# Altium footprint library PCBKU.PcbLib: 197 footprints (part 11 of 13)
Each footprint in its own frame and in the unit in brackets; x right, y up, seen from the top. Pads: shape width x height; smd on the part's side, far side on the other; paste and mask are expansions set on the pad; w line width, h text height; cw(c..) or ccw(c..) is an arc to the next point about the centre after c.
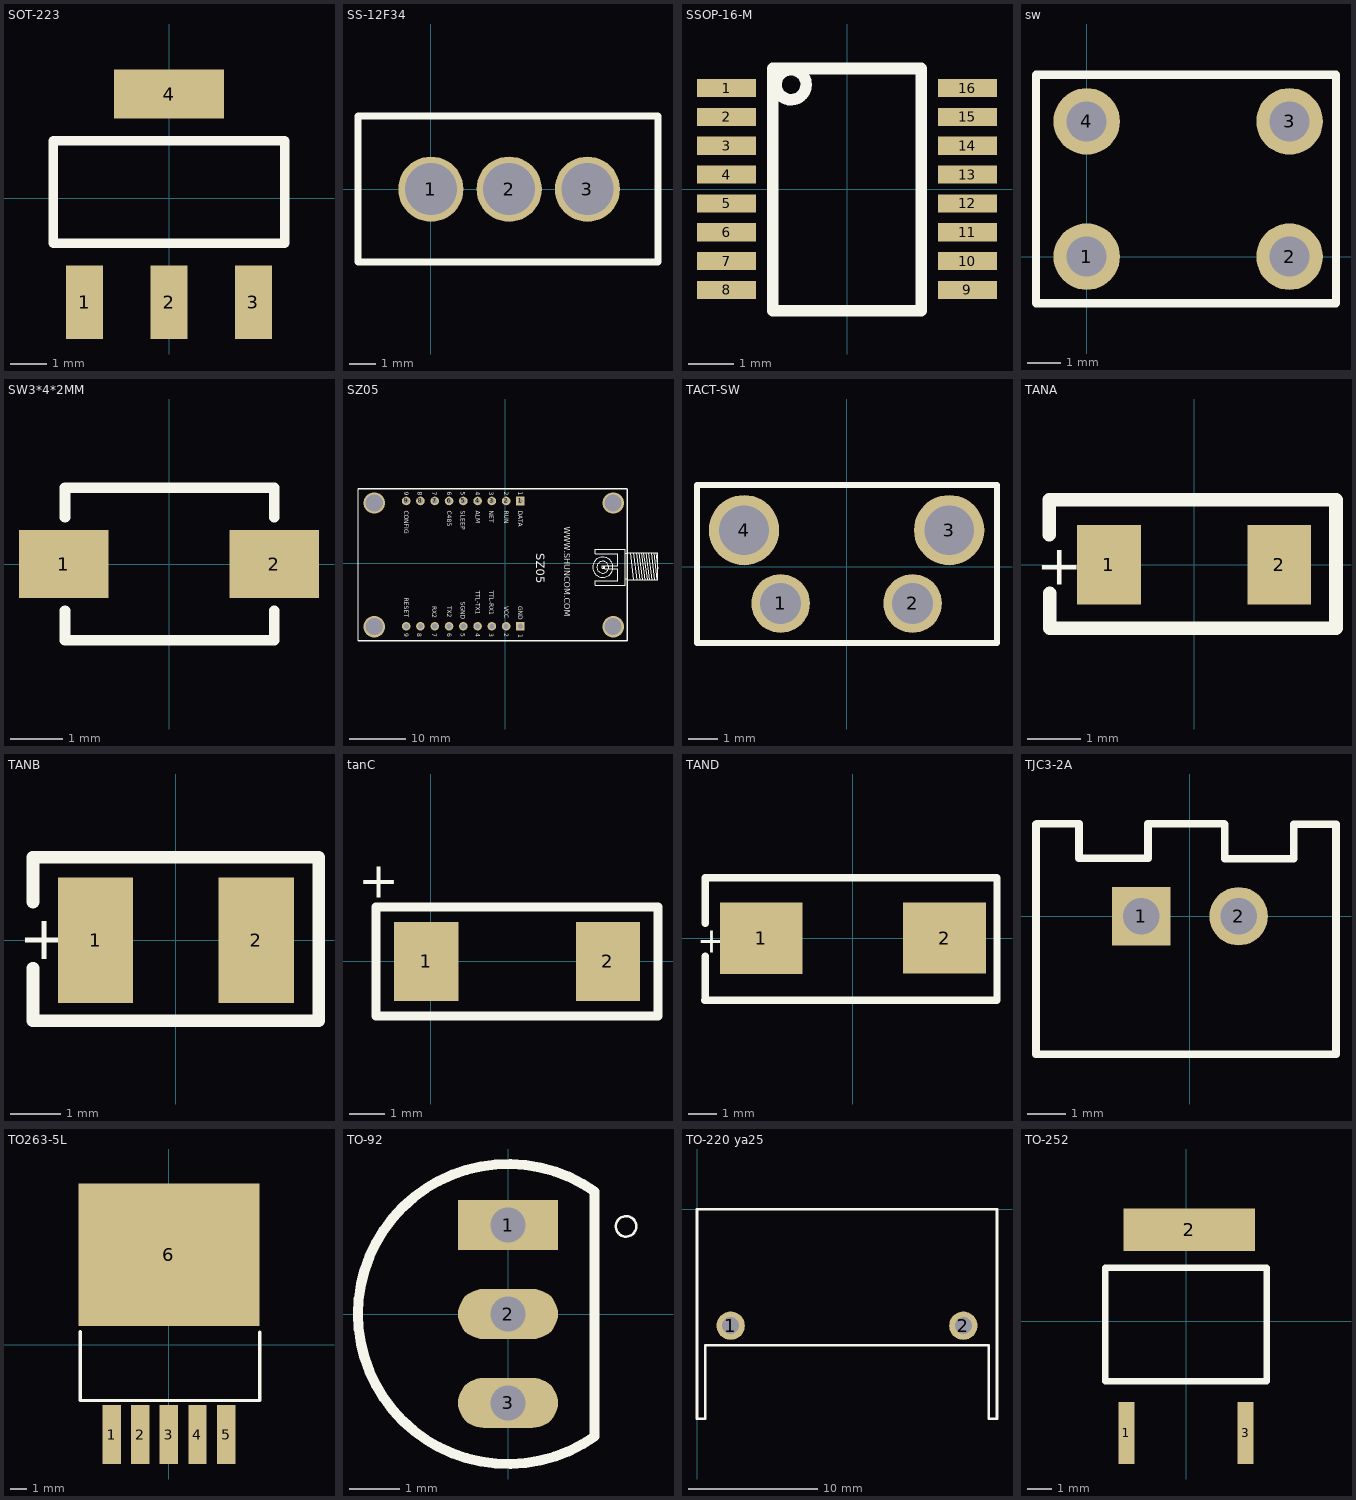
[diagram p10: the footprints below, top view; thin cyan lines are the x and y axes]

## SOT-223 [mm]
pads (4):
  rect 1x2 smd: 1(-2.3,-2.833) 2(0,-2.833) 3(2.3,-2.833)
  rect 3x1.33 smd: 4(0,2.833)
Top Overlay:
  lines w0.254: -3.15,-1.231 3.15,-1.231 3.15,1.563 -3.15,1.563 -3.15,-1.231
3D body: height 1.7, standoff 0.02, extent -3.25,-3.734 3.25,3.226

## SS-12F34 [mm]
pads (3):
  round 2.5 hole 2: 1(0,0) 2(3,0) 3(6,0)
Top Overlay:
  lines w0.254: -2.794,-2.794 8.706,-2.794 8.706,2.806 -2.794,2.806 -2.794,-2.794

## SSOP-16-M [mm]
pads (16):
  rect 1.3x0.4 smd: 1(-2.654,2.222) 2(-2.654,1.587) 3(-2.654,0.953) 4(-2.654,0.318) 5(-2.654,-0.318) 6(-2.654,-0.953) 7(-2.654,-1.587) 8(-2.654,-2.222) 9(2.654,-2.222) 10(2.654,-1.587) 11(2.654,-0.953) 12(2.654,-0.318) 13(2.654,0.318) 14(2.654,0.953) 15(2.654,1.587) 16(2.654,2.222)
Top Overlay:
  lines w0.254: -0.913,2.39 ccw(c-1.232,2.299) -0.901,2.299 ; -1.638,-2.68 1.638,-2.68 1.638,2.654 -1.638,2.654 -1.638,-2.68
3D body: height 1.7, standoff 0, extent -3.086,-2.476 3.111,2.502

## sw [mm]
pads (4):
  round 2 hole 1.2: 1(0,0) 2(6.096,0) 3(6.096,4.064) 4(0,4.064)
Top Overlay:
  lines w0.254: -1.524,-1.397 -1.524,5.461 7.493,5.461 7.493,-1.397 -1.524,-1.397

## SW3*4*2MM [mm]
pads (2):
  rect 1.7x1.3 smd: 1(-2.007,0) 2(2.007,0)
Top Overlay:
  lines w0.203: -1.981,-0.891 -1.981,-1.45 2.007,-1.45 2.007,-0.891 ; -1.981,0.891 -1.981,1.45 2.007,1.45 2.007,0.891

## SZ05 [mil] "SZ05-MODULE"
pads (18):
  rect 60x60 hole 36: 1(107.17,437.2) 18(107.17,-440.51)
  round 60 hole 36: 2(7.17,437.2) 3(-92.83,437.2) 4(-192.83,437.2) 5(-292.83,437.2) 6(-392.83,437.2) 7(-492.83,437.2) 8(-592.83,437.2) 9(-692.83,437.2) 10(-692.83,-440.51) 11(-592.83,-440.51) 12(-492.83,-440.51) 13(-392.83,-440.51) 14(-292.83,-440.51) 15(-192.83,-440.51) 16(-92.83,-440.51) 17(7.17,-440.51)
via -916.89,-442.75 diameter 150 hole 120
via 756.81,-442.75 diameter 150 hole 120
via -916.89,423.39 diameter 150 hole 120
via 756.81,423.39 diameter 150 hole 120
Top Overlay:
  circle w0.98: c684.41,-26.66 r70.87
  circle w0.98: c684.41,-26.66 r41.34
  circle w0.98: c684.41,-26.66 r7.87
  lines w2: 789.41,-10.66 789.41,-16.66 ; 876.41,75.34 899.41,-115.66 ; 899.41,75.34 921.41,-115.66 ; 917.41,75.34 942.41,-115.66 ; 936.41,75.34 962.41,-115.66 ; 953.41,75.34 978.41,-115.66 ; 969.41,75.34 994.41,-115.66 ; 984.41,75.34 1010.41,-115.66 ; 1004.41,75.34 1028.41,-115.66 ; 1022.41,75.34 1044.41,-115.66 ; 1041.41,75.34 1061.41,-115.66 ; 1056.41,75.34 1071.41,-36.66 ; 789.41,-16.66 789.41,68.34 631.41,68.34 631.41,98.34 789.41,98.34 ; 789.41,-16.66 697.41,-16.66 697.41,-25.66 697.41,-36.66 789.41,-36.66 789.41,-43.66 789.41,-122.66 631.41,-122.66 631.41,-152.66 789.41,-152.66 841.41,-152.66 841.41,-108.66 ; 789.41,98.34 841.41,98.34 ; 789.41,98.34 841.41,98.34 ; 841.41,-108.66 841.41,69.34 ; 841.41,-108.66 860.41,-108.66 860.41,-115.66 1071.41,-115.66 1071.41,75.34 860.41,75.34 860.41,69.34 841.41,69.34 ; 841.41,69.34 841.41,98.34
  lines w8: -1030.59,-540.62 -1030.59,522.42
  lines w10: -1030.59,-540.62 855.24,-540.62 855,520 ; -1030.59,522.42 855.24,522.42
  text "WWW.SHUNCOM.COM" at 415,255 h40
  text "RESET" at -706.09,-240 h30
  text "RX2" at -512.09,-299.98 h30
  text "TX2" at -403.82,-299.98 h30
  text "SGND" at -310.59,-269.99 h30
  text "TTL-TX1" at -206.97,-190.02 h30
  text "TTL-RX1" at -110.59,-190.02 h30
  text "VCC" at -6.12,-299.98 h30
  text "GND" at 93,-299.98 h30
  text "CONFIG" at -706.09,370 h30
  text "C485" at -403.82,370 h30
  text "SLEEP" at -310.59,370 h30
  text "ALM" at -206.97,370 h30
  text "NET" at -110.59,370 h30
  text "RUN" at -6.12,370 h30
  text "DATA" at 93,370 h30
  text "1" at 93,502.13 h30
  text "2" at -6.12,502.13 h30
  text "3" at -110.59,502.13 h30
  text "4" at -206.97,502.13 h30
  text "5" at -310.59,502.13 h30
  text "6" at -403.82,502.13 h30
  text "7" at -512.09,502.13 h30
  text "8" at -610.51,502.13 h30
  text "9" at -706.09,502.13 h30
  text "1" at 93,-495 h30
  text "2" at -6.12,-490 h30
  text "3" at -110.59,-490 h30
  text "4" at -206.97,-490 h30
  text "5" at -310.59,-490 h30
  text "6" at -403.82,-490 h30
  text "7" at -512.09,-490 h30
  text "8" at -615,-490 h30
  text "9" at -706.09,-490 h30
  text "SZ05" at 220,70 h60

## TACT-SW [mm]
pads (4):
  round 2 hole 1.4: 1(-2.25,-1.25) 2(2.25,-1.25)
  round 2.4 hole 1.7: 3(3.5,1.25) 4(-3.5,1.25)
Top Overlay:
  lines w0.203: -5.105,-2.596 -4.064,-2.596 5.131,-2.596 5.131,2.789 -5.105,2.789 -5.105,-2.596

## TANA [mm]
pads (2):
  rect 1.2x1.5 smd: 1(-1.6,0) 2(1.6,0)
Top Overlay:
  lines w0.254: -2.718,-0.533 -2.718,-1.194 2.667,-1.194 2.667,1.219 -2.718,1.219 -2.718,0.559
  text "+" at -2.972,-0.381 h0.76
3D body: height 1.6, standoff 0, extent -1.625,-0.838 1.575,0.762

## TANB [mm]
pads (2):
  rect 1.5x2.5 smd: 1(-1.6,0) 2(1.6,0)
Top Overlay:
  lines w0.254: -2.845,-0.559 -2.845,-1.6 2.845,-1.6 2.845,1.651 -2.845,1.651 -2.845,0.762
  text "+" at -3.124,-0.381 h0.89
3D body: height 1.9, standoff 0, extent -1.724,-1.378 1.776,1.422

## tanC [mm]
pads (2):
  rect 1.8x2.2 smd: 1(-0.127,0) 2(4.953,0)
Top Overlay:
  lines w0.254: -1.524,-1.524 6.35,-1.524 6.35,1.524 -1.524,1.524 -1.524,-1.524
  text "+" at -2.032,1.778 h1

## TAND [mm]
pads (2):
  rect 2.9x2.5 smd: 1(-3.213,-0.004) 2(3.213,0.004)
Top Overlay:
  lines w0.254: -5.207,-2.176 5.055,-2.176 5.055,2.117 -5.182,2.117 -5.182,0.51 ; -5.182,-2.176 -5.182,-0.635
  text "+" at -5.474,-0.512 h0.89

## TJC3-2A [mil]
pads (2):
  rect 60x60 hole 37.4: 1(-50,0)
  round 60 hole 37.4: 2(50,0)
Top Overlay:
  lines w8: -158,-141.73 -158,94.49 ; -157.31,95 -114,95 -114,59.57 -43.13,59.57 ; -157.09,-141.73 150,-141.73 150,94.49 106.69,94.49 106.69,59.06 35.83,59.06 35.83,94.49 ; -43,59.57 -43,95 35.31,95

## TO263-5L [mm]
pads (6):
  rect 1.1x3.5 smd: 1(-3.404,-5.359) 2(-1.702,-5.359) 3(0,-5.359) 4(1.702,-5.359) 5(3.404,-5.359)
  rect 10.8x8.5 smd: 6(0,5.359)
Top Overlay:
  lines w0.203: -5.283,0.775 -5.283,-3.327 5.41,-3.327 5.41,0.749

## TO-92 [mm]
pads (3):
  rect 2x1 hole 0.7: 1(0,1.778)
  oval 2x1 hole 0.7: 2(0,0) 3(0,-1.778)
Top Overlay:
  circle w0.051: c2.361,1.753 r0.205
  lines w0.2: 1.726,-2.454 cw(c0,0) 1.726,2.454 ; 1.727,-2.438 1.727,2.438

## TO-220 ya25 [mm]
pads (2):
  round 2.2 hole 1.3: 1(2.6,-9) 2(20.6,-9)
Top Overlay:
  lines w0.203: 0.63,-16.2 0,-16.2 0,0 23.2,0 23.2,-16.2 22.57,-16.2 ; 0.635,-16.18 0.635,-10.516 22.565,-10.516 22.565,-16.18

## TO-252 [mm]
pads (3):
  rect 0.65x2.5 smd: 1(-2.4,-4.5) 3(2.4,-4.5)
  rect 5.3x1.7 smd: 2(0.127,3.683)
Top Overlay:
  lines w0.254: -3.25,-2.413 3.25,-2.413 3.25,2.159 -3.25,2.159 -3.25,-2.413